# Altium schematic symbol library Wurth_Elektronik_Passive_rev16a.SCHLIB: 1143 symbols (part 8 of 27)
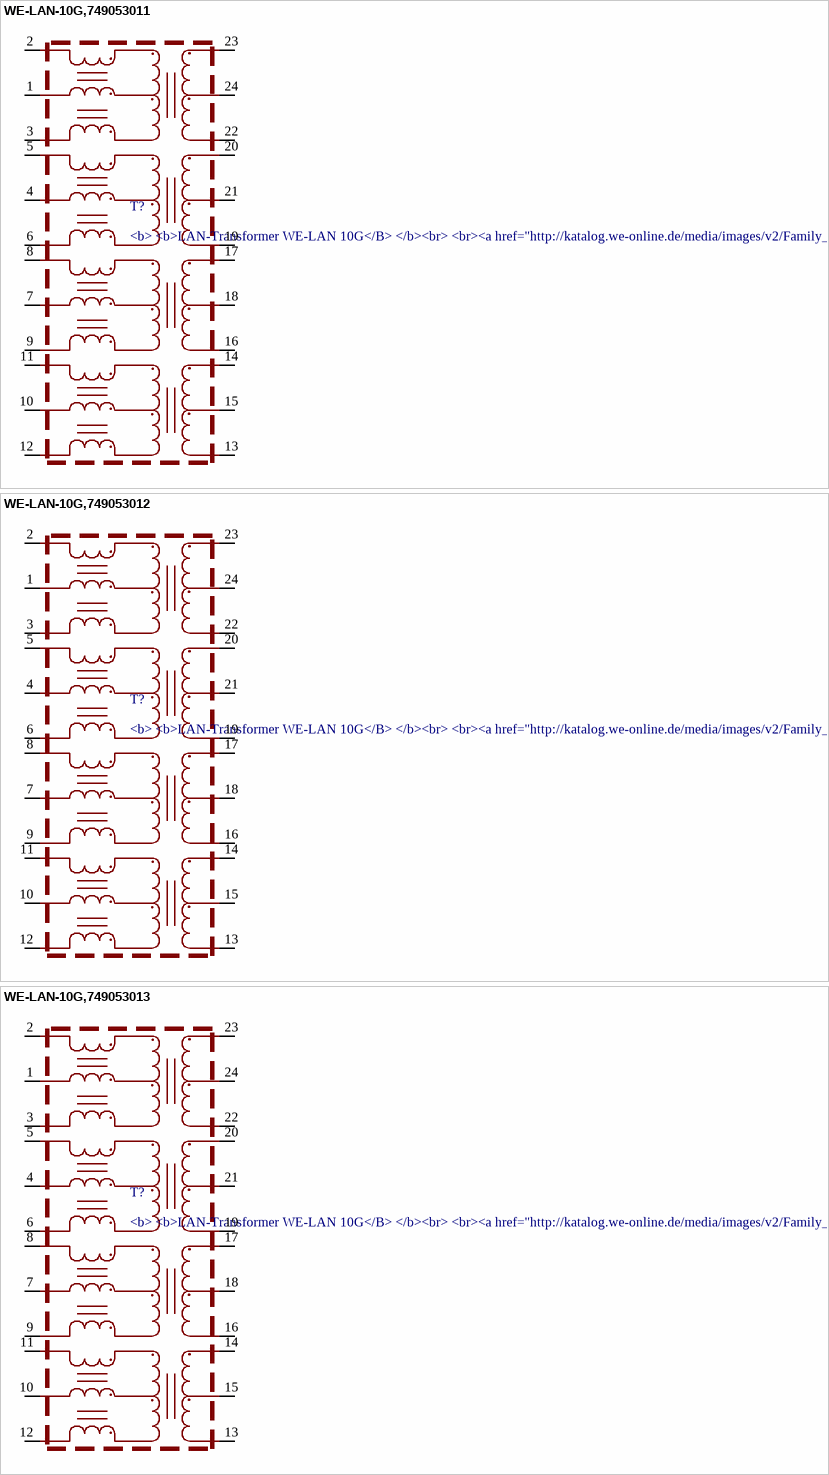
[diagram p65: symbols WE-LAN-10G,749053011 to WE-LAN-10G,749053013]

## WE-LAN-10G,749053013
designator T?, comment <b> / <b>LAN-Transformer WE-LAN 10G</B> / </b><br> / <br><a href="http://katalog.we-online.de/media/images/v2/Family_WE-LAN.jpg" title="Enlarge picture"> / <img src="http://katalog.we-online.de/media/images/v2/Family_WE-LAN.jpg"  width="320"></a><p> / </b><br> / Details see: <a href="http://katalog.we-online.de/en/pbs/WE-LAN/749053013?m">http://katalog.we-online.de/en/pbs/WE-LAN/749053013?m</a><p> / <b><br> / <br> / 2015 (C) Würth Elektronik
footprint WE-LAN10G:0.99MM
pins: 1 TCT1, 2 TD1+, 3 TD1-, 4 TCT2, 5 TD2+, 6 TD2-, 7 TCT3, 8 TD3+, 9 TD3-, 10 TCT4, 11 TD4+, 12 TD4-, 13 MX4-, 14 MX4+, 15 MCT4, 16 MX3-, 17 MX3+, 18 MCT3, 19 MX2-, 20 MX2+, 21 MCT2, 22 MX1-, 23 MX1+, 24 MCT1

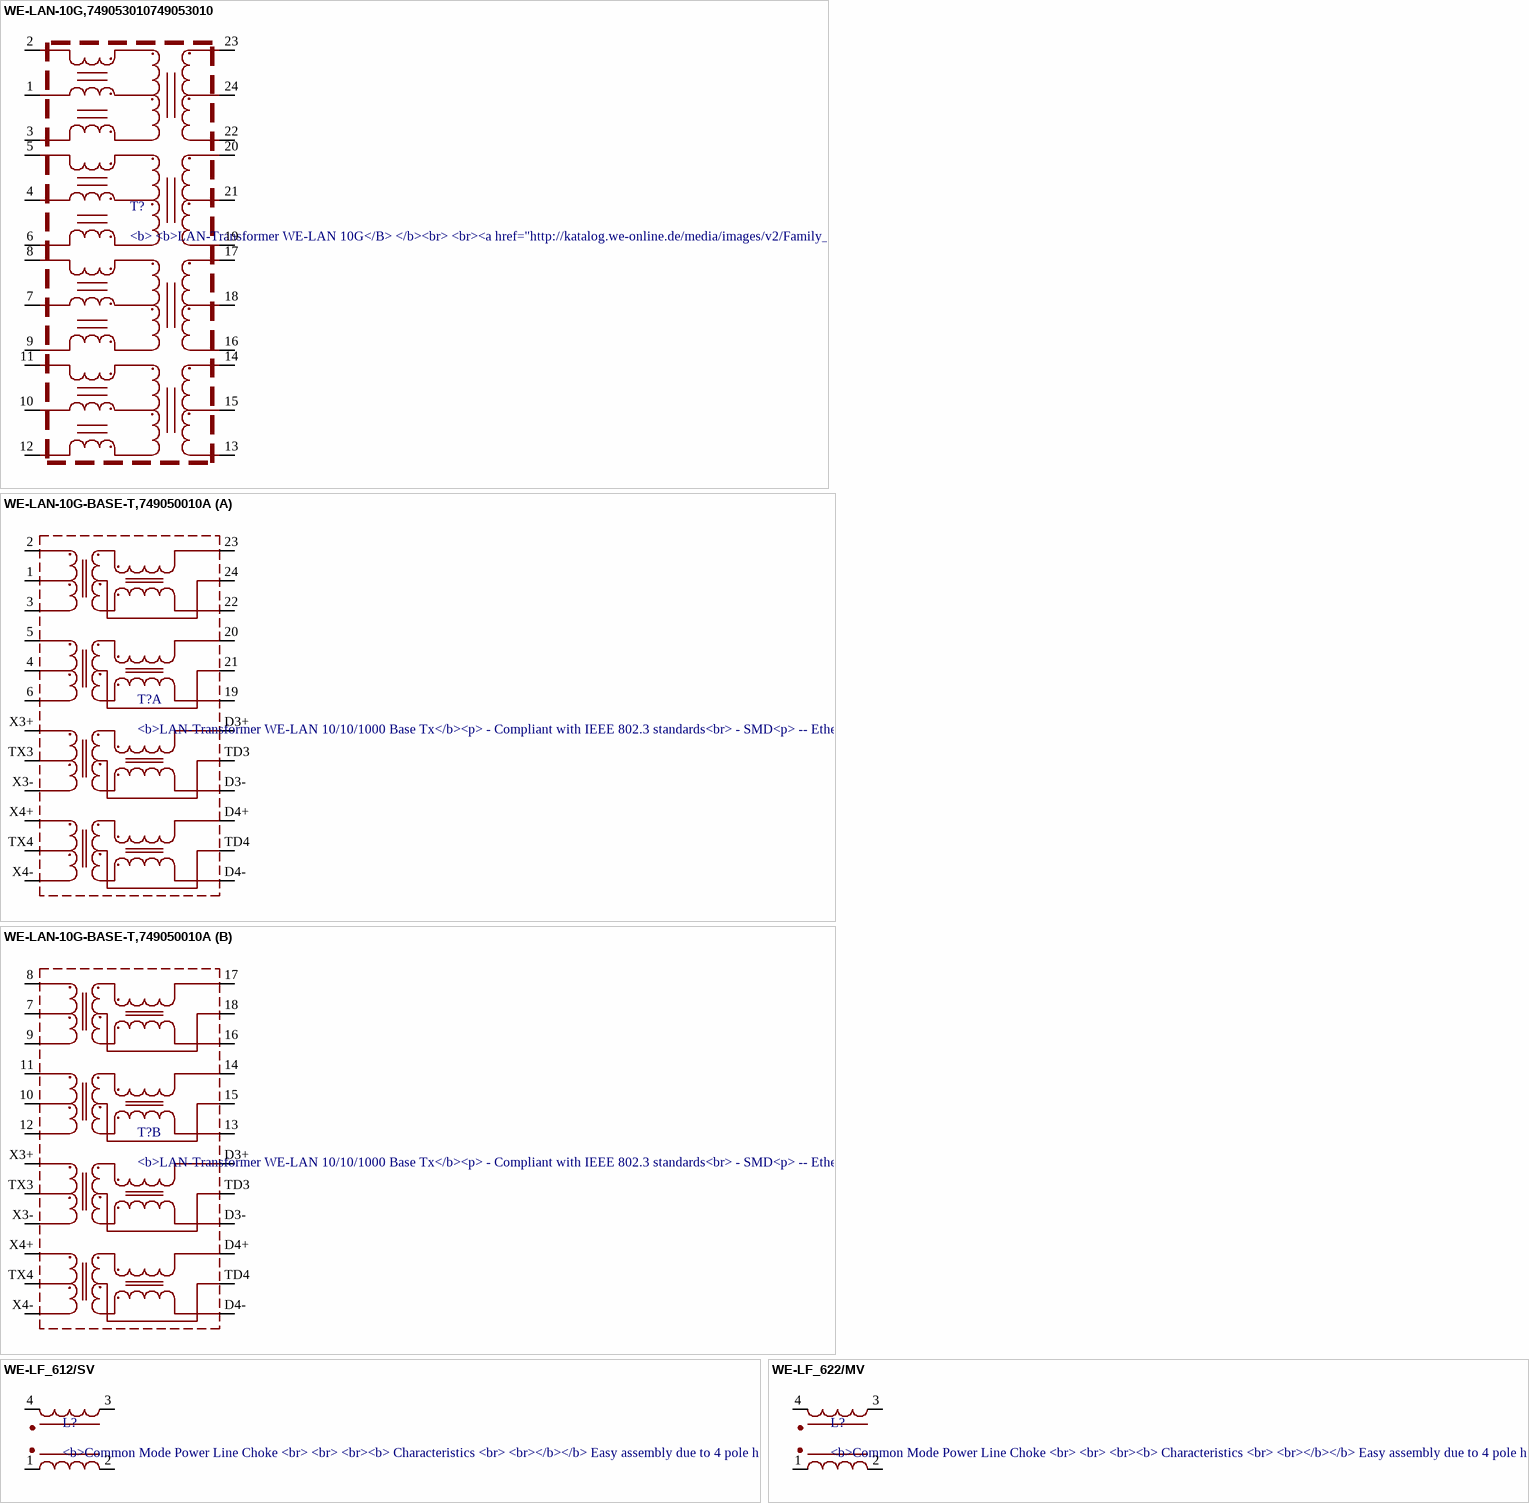
[diagram p21: symbols WE-LAN-10G,749053010749053010 to WE-LF_622/MV]

## WE-LAN-10G,749053010749053010
designator T?, comment <b> / <b>LAN-Transformer WE-LAN 10G</B> / </b><br> / <br><a href="http://katalog.we-online.de/media/images/v2/Family_WE-LAN.jpg" title="Enlarge picture"> / <img src="http://katalog.we-online.de/media/images/v2/Family_WE-LAN.jpg"  width="320"></a><p> / </b><br> / Details see: <a href="http://katalog.we-online.de/en/pbs/WE-LAN/749053010?m">http://katalog.we-online.de/en/pbs/WE-LAN/749053010?m</a><p> / <b><br> / <br> / 2015 (C) Würth Elektronik
footprint WE-LAN10G:0.99MM
pins: 1 TCT1, 2 TD1+, 3 TD1-, 4 TCT2, 5 TD2+, 6 TD2-, 7 TCT3, 8 TD3+, 9 TD3-, 10 TCT4, 11 TD4+, 12 TD4-, 13 MX4-, 14 MX4+, 15 MCT4, 16 MX3-, 17 MX3+, 18 MCT3, 19 MX2-, 20 MX2+, 21 MCT2, 22 MX1-, 23 MX1+, 24 MCT1

## WE-LAN-10G-BASE-T,749050010A
designator T?, comment <b>LAN-Transformer WE-LAN 10/10/1000 Base Tx</b><p> / - Compliant with IEEE 802.3 standards<br> / - SMD<p> / -- Ethernet<br> / -- Power over Ethernet<br> / -- 10 Gigabit Ethernet<br> / -- Compliant with most IC's for ethernet applications like Intel, AMD, Globespan and Realtek<br> / -- Hub, Router, Switch / <br><a href=http://katalog.we-online.de/media/images/eisos/UtLAN_pf2.jpg" title="Enlarge picture"> / <img src="http://katalog.we-online.de/media/images/eisos/UtLAN_pf2.jpg" width="320"></a><p> / Details see: <a href="http://katalog.we-online.de/en/pbs/WE-LAN/S/749050010A?">http://katalog.we-online.de/en/pbs/WE-LAN/S/749050010A?</a><p> / Updated by  Dan Xu 2014-07-08<br> / 2014 (C) Würth Elektronik
MANUFACTURER: Würth Elektronik eiSos GmbH; CREATED-BY: Christin Zierenner; COMPANY-URL: http://www.we-online.de; CREATED-DATE: June 2012; DATASHEET-URL: http://katalog.we-online.de/kataloge/eisos/media/pdf/749050010A.pdf
footprint 749050010A
part A pins: 1 TX1, 2 X1+, 3 X1-, 4 TX2, 5 X2+, 6 X2-, 19 D2-, 20 D2+, 21 TD2, 22 D1-, 23 D1+, 24 TD1, D3+, D3-, D4+, D4-, TD3, TD4, TX3, TX4, X3+, X3-, X4+, X4-
part B pins: 7 TX1, 8 X1+, 9 X1-, 10 TX2, 11 X2+, 12 X2-, 13 D2-, 14 D2+, 15 TD2, 16 D1-, 17 D1+, 18 TD1, D3+, D3-, D4+, D4-, TD3, TD4, TX3, TX4, X3+, X3-, X4+, X4-

## WE-LF_612/SV
designator L?, comment <b>Common Mode Power Line Choke / <br> / <br> / <br><b> Characteristics / <br> / <br></b></b> Easy assembly due to 4 pole housing / <br> / <br> Compact, small size / <br> / <br> 4 soldering pins for perfect mechanical decoupling / <br> / <br> Toroidal core choke with sector winding / <br> / <br> High interference suppression for common mode interferences in low and middle frequency ranges / <br> / <br> Low stray field / <br> / <br> Operating temperature: –25 ºC to +125 ºC / <br> / <br> Custom designs on request / <br> / <br> / <br><b> Applications / <br> / <br></b> Power line filter / <br> / <br> Power electronics / <br> / <br> SMPS / <br> / <br> Suppression of common mode noise / <br> / <br> / <br><a href=http://katalog.we-online.de/media/images/eisos/IndLF_pf2.jpg" title="Enlarge picture"> / <img src="http://katalog.we-online.de/media/images/eisos/IndLF_pf2.jpg" width="320"></a><p> / Details see: <a href="http://katalog.we-online.de/en/pbs/WE-LF?">http://katalog.we-online.de/en/pbs/WE-LF?</a><p> / Updated by  Dan Xu 2014-07-08<br> / 2014 (C) Wurth Elektronik
footprint WE-LF_612/SV
pins: 1 4, 2 3, 3 2, 4 1

## WE-LF_622/MV
designator L?, comment <b>Common Mode Power Line Choke / <br> / <br> / <br><b> Characteristics / <br> / <br></b></b> Easy assembly due to 4 pole housing / <br> / <br> Compact, small size / <br> / <br> 4 soldering pins for perfect mechanical decoupling / <br> / <br> Toroidal core choke with sector winding / <br> / <br> High interference suppression for common mode interferences in low and middle frequency ranges / <br> / <br> Low stray field / <br> / <br> Operating temperature: –25 ºC to +125 ºC / <br> / <br> Custom designs on request / <br> / <br> / <br><b> Applications / <br> / <br></b> Power line filter / <br> / <br> Power electronics / <br> / <br> SMPS / <br> / <br> Suppression of common mode noise / <br> / <br> / <br><a href=http://katalog.we-online.de/media/images/eisos/IndLF_pf2.jpg" title="Enlarge picture"> / <img src="http://katalog.we-online.de/media/images/eisos/IndLF_pf2.jpg" width="320"></a><p> / Details see: <a href="http://katalog.we-online.de/en/pbs/WE-LF?">http://katalog.we-online.de/en/pbs/WE-LF?</a><p> / Updated by  Dan Xu 2014-07-08<br> / 2014 (C) Wurth Elektronik
footprint WE-LF_622/MV
pins: 1 4, 2 3, 3 2, 4 1

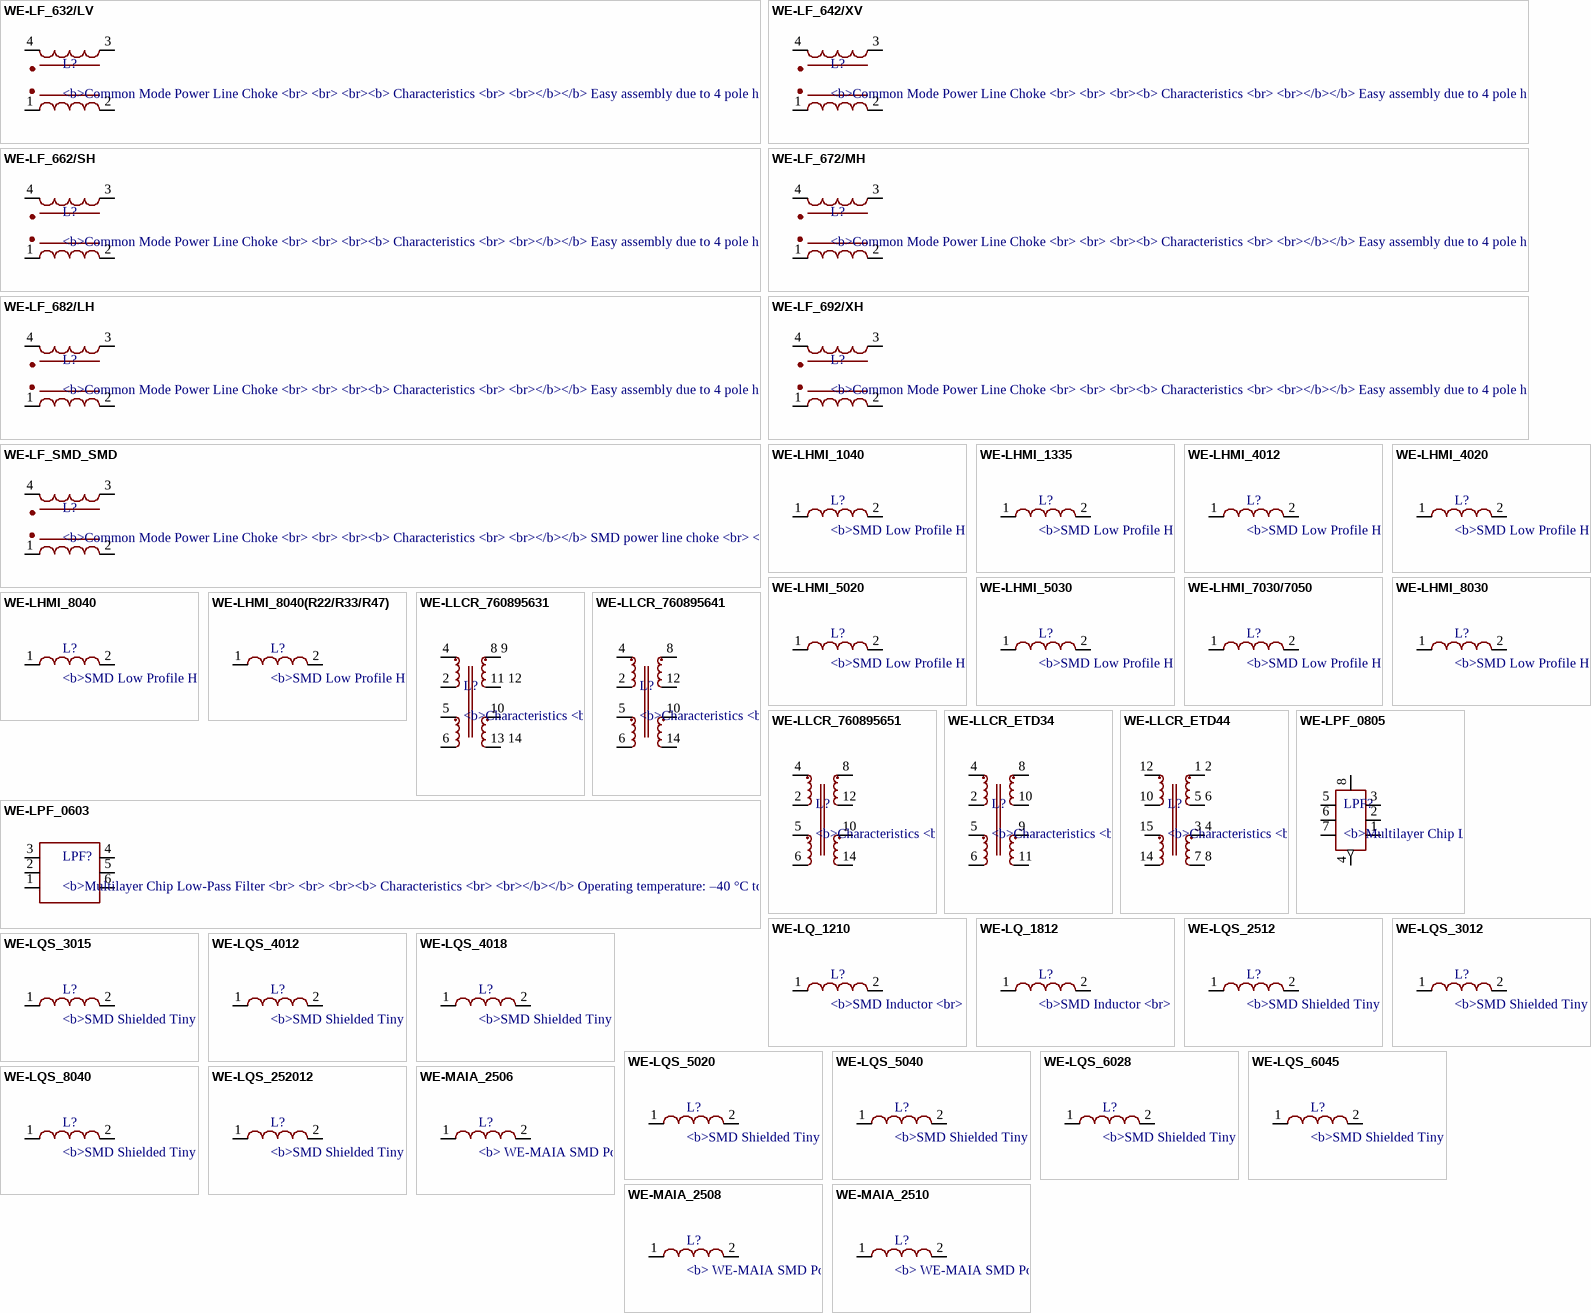
[diagram p22: symbols WE-LF_632/LV to WE-MAIA_2510]

## WE-LF_632/LV
designator L?, comment <b>Common Mode Power Line Choke / <br> / <br> / <br><b> Characteristics / <br> / <br></b></b> Easy assembly due to 4 pole housing / <br> / <br> Compact, small size / <br> / <br> 4 soldering pins for perfect mechanical decoupling / <br> / <br> Toroidal core choke with sector winding / <br> / <br> High interference suppression for common mode interferences in low and middle frequency ranges / <br> / <br> Low stray field / <br> / <br> Operating temperature: –25 ºC to +125 ºC / <br> / <br> Custom designs on request / <br> / <br> / <br><b> Applications / <br> / <br></b> Power line filter / <br> / <br> Power electronics / <br> / <br> SMPS / <br> / <br> Suppression of common mode noise / <br> / <br> / <br><a href=http://katalog.we-online.de/media/images/eisos/IndLF_pf2.jpg" title="Enlarge picture"> / <img src="http://katalog.we-online.de/media/images/eisos/IndLF_pf2.jpg" width="320"></a><p> / Details see: <a href="http://katalog.we-online.de/en/pbs/WE-LF?">http://katalog.we-online.de/en/pbs/WE-LF?</a><p> / Updated by  Dan Xu 2014-07-08<br> / 2014 (C) Wurth Elektronik
footprint WE-LF_632/LV
pins: 1 4, 2 3, 3 2, 4 1

## WE-LF_642/XV
designator L?, comment <b>Common Mode Power Line Choke / <br> / <br> / <br><b> Characteristics / <br> / <br></b></b> Easy assembly due to 4 pole housing / <br> / <br> Compact, small size / <br> / <br> 4 soldering pins for perfect mechanical decoupling / <br> / <br> Toroidal core choke with sector winding / <br> / <br> High interference suppression for common mode interferences in low and middle frequency ranges / <br> / <br> Low stray field / <br> / <br> Operating temperature: –25 ºC to +125 ºC / <br> / <br> Custom designs on request / <br> / <br> / <br><b> Applications / <br> / <br></b> Power line filter / <br> / <br> Power electronics / <br> / <br> SMPS / <br> / <br> Suppression of common mode noise / <br> / <br> / <br><a href=http://katalog.we-online.de/media/images/eisos/IndLF_pf2.jpg" title="Enlarge picture"> / <img src="http://katalog.we-online.de/media/images/eisos/IndLF_pf2.jpg" width="320"></a><p> / Details see: <a href="http://katalog.we-online.de/en/pbs/WE-LF?">http://katalog.we-online.de/en/pbs/WE-LF?</a><p> / Updated by  Dan Xu 2014-07-08<br> / 2014 (C) Wurth Elektronik
footprint WE-LF_642/XV
pins: 1 4, 2 3, 3 2, 4 1

## WE-LF_662/SH
designator L?, comment <b>Common Mode Power Line Choke / <br> / <br> / <br><b> Characteristics / <br> / <br></b></b> Easy assembly due to 4 pole housing / <br> / <br> Compact, small size / <br> / <br> 4 soldering pins for perfect mechanical decoupling / <br> / <br> Toroidal core choke with sector winding / <br> / <br> High interference suppression for common mode interferences in low and middle frequency ranges / <br> / <br> Low stray field / <br> / <br> Operating temperature: –25 ºC to +125 ºC / <br> / <br> Custom designs on request / <br> / <br> / <br><b> Applications / <br> / <br></b> Power line filter / <br> / <br> Power electronics / <br> / <br> SMPS / <br> / <br> Suppression of common mode noise / <br> / <br> / <br><a href=http://katalog.we-online.de/media/images/eisos/IndLF_pf2.jpg" title="Enlarge picture"> / <img src="http://katalog.we-online.de/media/images/eisos/IndLF_pf2.jpg" width="320"></a><p> / Details see: <a href="http://katalog.we-online.de/en/pbs/WE-LF?">http://katalog.we-online.de/en/pbs/WE-LF?</a><p> / Updated by  Dan Xu 2014-07-08<br> / 2014 (C) Wurth Elektronik
footprint WE-LF_662/SH
pins: 1 4, 2 3, 3 2, 4 1

## WE-LF_672/MH
designator L?, comment <b>Common Mode Power Line Choke / <br> / <br> / <br><b> Characteristics / <br> / <br></b></b> Easy assembly due to 4 pole housing / <br> / <br> Compact, small size / <br> / <br> 4 soldering pins for perfect mechanical decoupling / <br> / <br> Toroidal core choke with sector winding / <br> / <br> High interference suppression for common mode interferences in low and middle frequency ranges / <br> / <br> Low stray field / <br> / <br> Operating temperature: –25 ºC to +125 ºC / <br> / <br> Custom designs on request / <br> / <br> / <br><b> Applications / <br> / <br></b> Power line filter / <br> / <br> Power electronics / <br> / <br> SMPS / <br> / <br> Suppression of common mode noise / <br> / <br> / <br><a href=http://katalog.we-online.de/media/images/eisos/IndLF_pf2.jpg" title="Enlarge picture"> / <img src="http://katalog.we-online.de/media/images/eisos/IndLF_pf2.jpg" width="320"></a><p> / Details see: <a href="http://katalog.we-online.de/en/pbs/WE-LF?">http://katalog.we-online.de/en/pbs/WE-LF?</a><p> / Updated by  Dan Xu 2014-07-08<br> / 2014 (C) Wurth Elektronik
footprint WE-LF_672/MH
pins: 1 4, 2 3, 3 2, 4 1

## WE-LF_682/LH
designator L?, comment <b>Common Mode Power Line Choke / <br> / <br> / <br><b> Characteristics / <br> / <br></b></b> Easy assembly due to 4 pole housing / <br> / <br> Compact, small size / <br> / <br> 4 soldering pins for perfect mechanical decoupling / <br> / <br> Toroidal core choke with sector winding / <br> / <br> High interference suppression for common mode interferences in low and middle frequency ranges / <br> / <br> Low stray field / <br> / <br> Operating temperature: –25 ºC to +125 ºC / <br> / <br> Custom designs on request / <br> / <br> / <br><b> Applications / <br> / <br></b> Power line filter / <br> / <br> Power electronics / <br> / <br> SMPS / <br> / <br> Suppression of common mode noise / <br> / <br> / <br><a href=http://katalog.we-online.de/media/images/eisos/IndLF_pf2.jpg" title="Enlarge picture"> / <img src="http://katalog.we-online.de/media/images/eisos/IndLF_pf2.jpg" width="320"></a><p> / Details see: <a href="http://katalog.we-online.de/en/pbs/WE-LF?">http://katalog.we-online.de/en/pbs/WE-LF?</a><p> / Updated by  Dan Xu 2014-07-08<br> / 2014 (C) Wurth Elektronik
footprint WE-LF_682/LH
pins: 1 4, 2 3, 3 2, 4 1

## WE-LF_692/XH
designator L?, comment <b>Common Mode Power Line Choke / <br> / <br> / <br><b> Characteristics / <br> / <br></b></b> Easy assembly due to 4 pole housing / <br> / <br> Compact, small size / <br> / <br> 4 soldering pins for perfect mechanical decoupling / <br> / <br> Toroidal core choke with sector winding / <br> / <br> High interference suppression for common mode interferences in low and middle frequency ranges / <br> / <br> Low stray field / <br> / <br> Operating temperature: –25 ºC to +125 ºC / <br> / <br> Custom designs on request / <br> / <br> / <br><b> Applications / <br> / <br></b> Power line filter / <br> / <br> Power electronics / <br> / <br> SMPS / <br> / <br> Suppression of common mode noise / <br> / <br> / <br><a href=http://katalog.we-online.de/media/images/eisos/IndLF_pf2.jpg" title="Enlarge picture"> / <img src="http://katalog.we-online.de/media/images/eisos/IndLF_pf2.jpg" width="320"></a><p> / Details see: <a href="http://katalog.we-online.de/en/pbs/WE-LF?">http://katalog.we-online.de/en/pbs/WE-LF?</a><p> / Updated by  Dan Xu 2014-07-08<br> / 2014 (C) Wurth Elektronik
footprint WE-LF_692/XH
pins: 1 4, 2 3, 3 2, 4 1

## WE-LF_SMD_SMD
designator L?, comment <b>Common Mode Power Line Choke / <br> / <br> / <br><b> Characteristics / <br> / <br></b></b> SMD power line choke / <br> / <br> Compact size / <br> / <br> Toroidal core with sector winding / <br> / <br> High attenuation of common mode interferences in low and middle frequency range / <br> / <br> Operating temperature: –25 ºC to +125 ºC / <br> / <br> / <br><b> Applications / <br> / <br></b> Mains filter / <br> / <br> Power electronics / <br> / <br> SMPS / <br> / <br> / <br> / <br><a href=http://katalog.we-online.de/media/images/eisos/IndLF_SMD_pf2.jpg" title="Enlarge picture"> / <img src="http://katalog.we-online.de/media/images/eisos/IndLF_SMD_pf2.jpg" width="320"></a><p> / Details see: <a href="http://katalog.we-online.de/en/pbs/WE-LF_SMD?">http://katalog.we-online.de/en/pbs/WE-LF_SMD?</a><p> / Updated by  Dan Xu 2014-07-08<br> / 2014 (C) Wurth Elektronik
footprint WE-LF_SMD
pins: 1 4, 2 3, 3 2, 4 1

## WE-LHMI_1040
designator L?, comment <b>SMD Low Profile High Current Molded Inductor / <br> / <br> / <br><b> Characteristics / <br> / <br></b></b> Compact design / <br> / <br> Magnetically shielded / <br> / <br> High current capability / <br> / <br> Handles high transient current spikes / <br> / <br> No acoustic noise and no leakage field / <br> / <br> Frequency range up to 5 MHz / <br> / <br> Operating temperature: –40 °C to +125 °C / <br> / <Br> / <br><b>Applications / <br> / <br></b> DC/DC converters for high current power supplies / <br> / <br> DC/DC converters for Field Programmable Gate Array (FPGA) / <br> / <br> POL converters / <br> / <br> Portable power like PDA, digital cameras / <br> / <br> Mainboards/graphic cards / <br> / <br> Battery powered devices / <br> / <br> / <br><a href=http://katalog.we-online.de/media/images/eisos/IndLHMI_pf2.jpg" title="Enlarge picture"> / <img src="http://katalog.we-online.de/media/images/eisos/IndLHMI_pf2.jpg" width="320"></a><p> / Details see: <a href="http://katalog.we-online.de/en/pbs/WE-LHMI?">http://katalog.we-online.de/en/pbs/WE-LHMI?</a><p> / Updated by  Dan Xu 2014-07-08<br> / 2014 (C) Wurth Elektronik
footprint WE-LHMI_1040
pins: 1, 2

## WE-LHMI_1335
designator L?, comment <b>SMD Low Profile High Current Molded Inductor / <br> / <br> / <br><b> Characteristics / <br> / <br></b></b> Compact design / <br> / <br> Magnetically shielded / <br> / <br> High current capability / <br> / <br> Handles high transient current spikes / <br> / <br> No acoustic noise and no leakage field / <br> / <br> Frequency range up to 5 MHz / <br> / <br> Operating temperature: –40 °C to +125 °C / <br> / <Br> / <br><b>Applications / <br> / <br></b> DC/DC converters for high current power supplies / <br> / <br> DC/DC converters for Field Programmable Gate Array (FPGA) / <br> / <br> POL converters / <br> / <br> Portable power like PDA, digital cameras / <br> / <br> Mainboards/graphic cards / <br> / <br> Battery powered devices / <br> / <br> / <br><a href=http://katalog.we-online.de/media/images/eisos/IndLHMI_pf2.jpg" title="Enlarge picture"> / <img src="http://katalog.we-online.de/media/images/eisos/IndLHMI_pf2.jpg" width="320"></a><p> / Details see: <a href="http://katalog.we-online.de/en/pbs/WE-LHMI?">http://katalog.we-online.de/en/pbs/WE-LHMI?</a><p> / Updated by  Dan Xu 2014-07-08<br> / 2014 (C) Wurth Elektronik
footprint WE-LHMI_1335
pins: 1, 2

## WE-LHMI_4012
designator L?, comment <b>SMD Low Profile High Current Molded Inductor / <br> / <br> / <br><b> Characteristics / <br> / <br></b></b> Compact design / <br> / <br> Magnetically shielded / <br> / <br> High current capability / <br> / <br> Handles high transient current spikes / <br> / <br> No acoustic noise and no leakage field / <br> / <br> Frequency range up to 5 MHz / <br> / <br> Operating temperature: –40 °C to +125 °C / <br> / <Br> / <br><b>Applications / <br> / <br></b> DC/DC converters for high current power supplies / <br> / <br> DC/DC converters for Field Programmable Gate Array (FPGA) / <br> / <br> POL converters / <br> / <br> Portable power like PDA, digital cameras / <br> / <br> Mainboards/graphic cards / <br> / <br> Battery powered devices / <br> / <br> / <br><a href=http://katalog.we-online.de/media/images/eisos/IndLHMI_pf2.jpg" title="Enlarge picture"> / <img src="http://katalog.we-online.de/media/images/eisos/IndLHMI_pf2.jpg" width="320"></a><p> / Details see: <a href="http://katalog.we-online.de/en/pbs/WE-LHMI?">http://katalog.we-online.de/en/pbs/WE-LHMI?</a><p> / Updated by  Dan Xu 2014-07-08<br> / 2014 (C) Wurth Elektronik
footprint WE-LHMI_4012
pins: 1, 2
